# Altium schematic symbol library Linear Technology Power Management Switching Regulator LTC1174-LTC3901.SchLib: 2647 symbols (part 38 of 197)
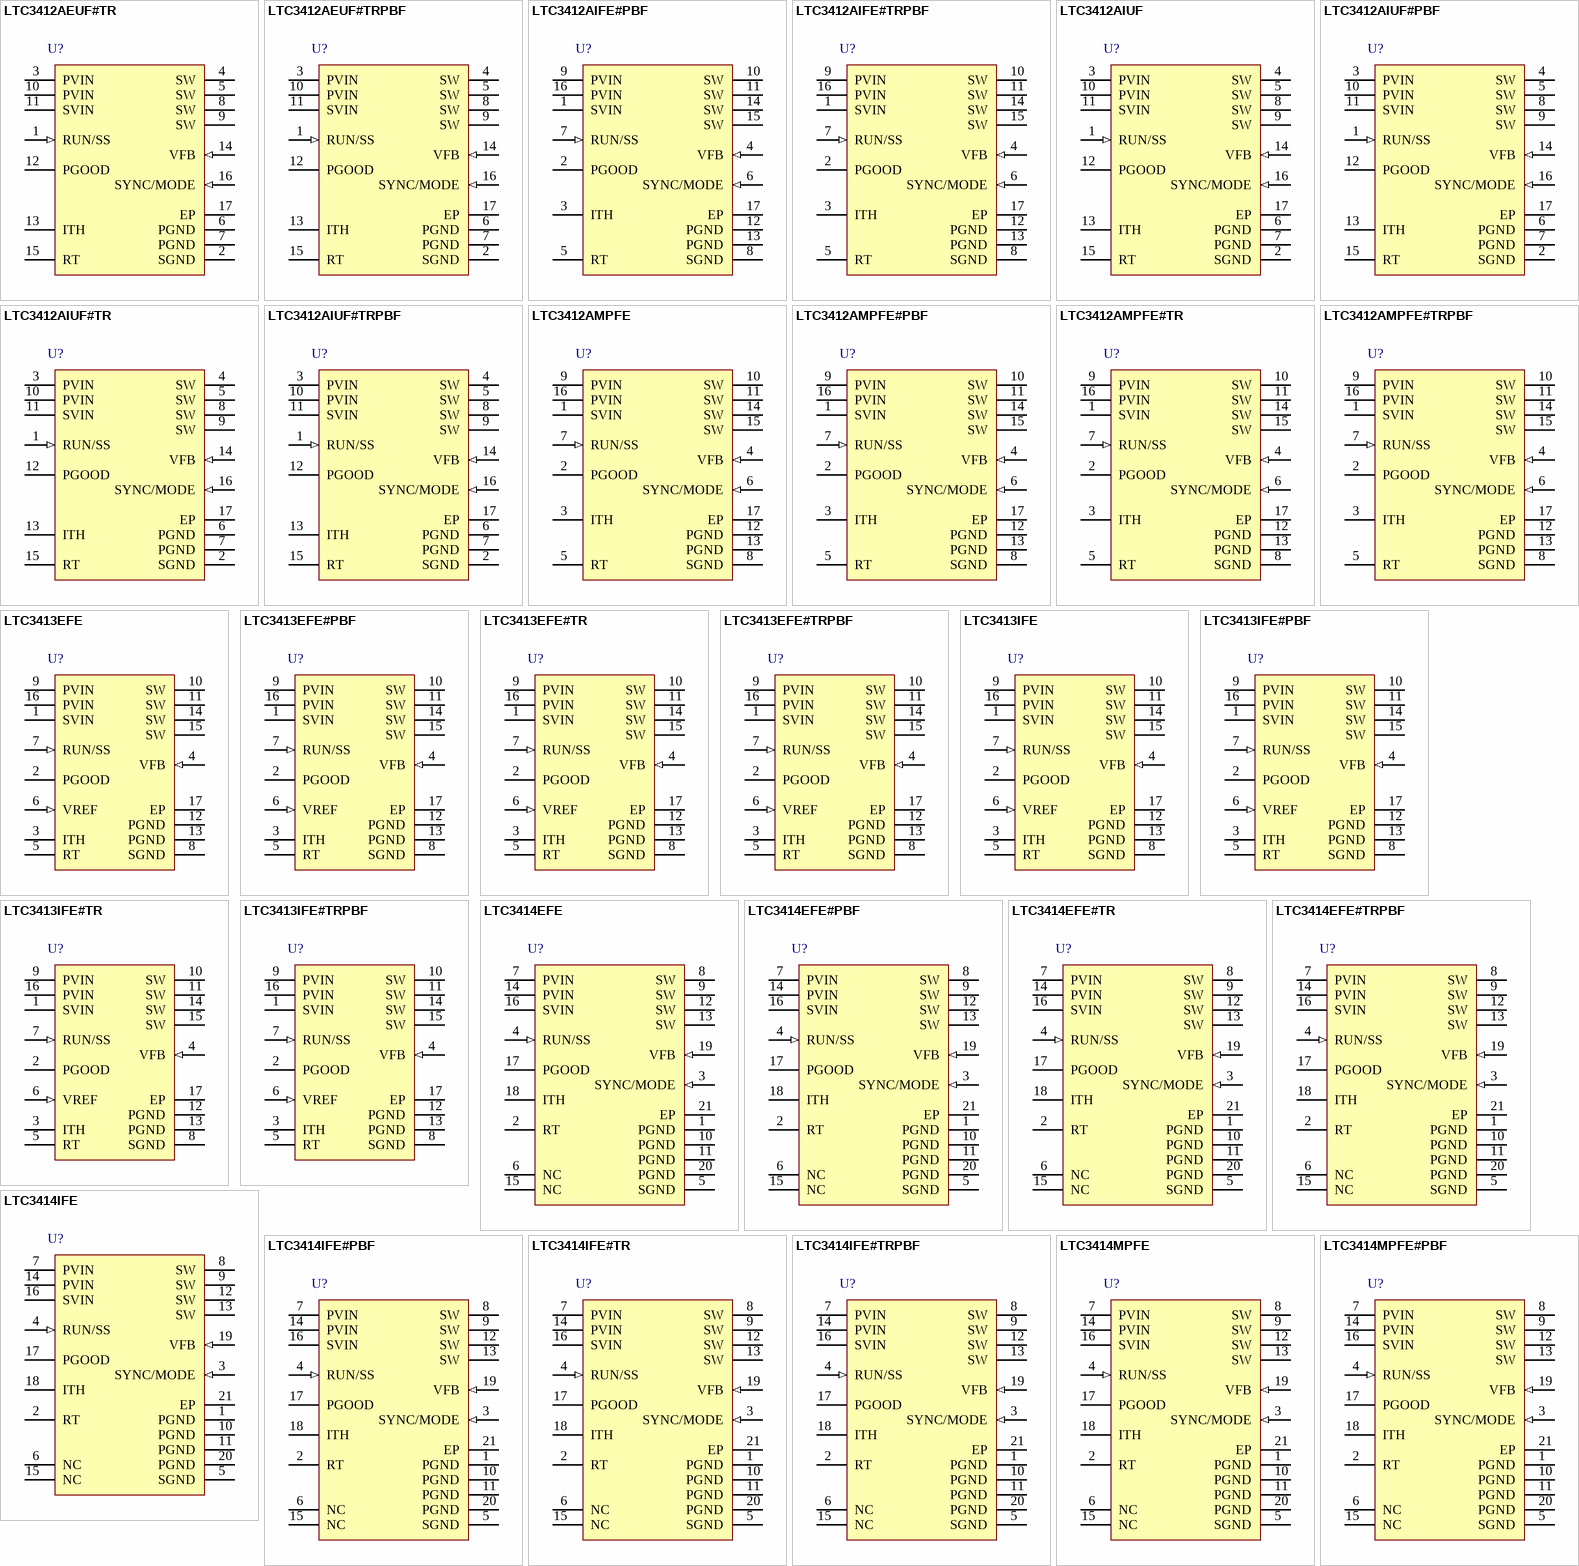
[diagram p153: symbols LTC3412AEUF#TR to LTC3414MPFE#PBF]

## LTC3414MPFE#PBF
designator U?
4 A, 4 MHz, Monolithic Synchronous Step-Down Regulator, 20-pin SOP (FE-20-EPV-CA), -55 to 125 degC, Pb-Free; Manufacturer: Linear Technology; PartNumber: LTC3414MPFE#PBF; Frequency Sync Range: 300kHz - 4MHz; Number of Outputs: 1; DatasheetVersion: Rev. B; PackageVersion: Rev. I, 05/2011; PackageReference: FE-20; PackageDescription: 20-Pin Plastic TSSOP, Body 6.5 x 4.4 mm, Pitch 0.65 mm; Supplier 1: Digi-Key; Supplier Part Number 1: LTC3414MPFE#PBF-ND; Supplier 2: Newark; Supplier Part Number 2: 13T8325; RoHS: TRUE; Mounting Technology: Surface Mount; ComponentLink1Description: Manufacturer URL; ComponentLink1URL: http://www.linear.com/; ComponentLink2Description: Datasheet; ComponentLink2URL: http://cds.linear.com/docs/en/datasheet/3414fb.pdf; ComponentLink3Description: Package Specification; ComponentLink3URL: http://cds.linear.com/docs/en/packaging/05081663__JFE20(CA).pdf
footprint LT-FE-20-EPV-CA_N (SOP, 20-Leads, Body 6.6x4.5mm, Pitch 0.65mm, Thermal Pad 4.95x2.74mm, IPC Medium Density)
footprint LT-FE-20-EPV-CA_L (SOP, 20-Leads, Body 6.6x4.5mm, Pitch 0.65mm, Thermal Pad 4.95x2.74mm, IPC High Density)
footprint LT-FE-20-EPV-CA_M (SOP, 20-Leads, Body 6.6x4.5mm, Pitch 0.65mm, Thermal Pad 4.95x2.74mm, IPC Low Density)
pins: 1 PGND (power) "Power Ground. Connect this pin closely to the (-) terminal of CIN and COUT.", 2 RT "Oscillator Resistor Input. Connecting a resistor to ground from this pin sets the switching frequency.", 3 SYNC/MODE (in) "Mode Select and External Clock Synchronization Input. To select Forced Continuous, tie to SVIN. Connecting this pin to a voltage between 0V and 1V selects Burst Mode operation with the burst clamp set to the pin voltage.", 4 RUN/SS (in) "Run Control and Soft-Start Input. Forcing this pin below 0.5V shuts down the LTC3414. In shutdown all functions are disabled. Less than 1uA of supply current is consumed. A capacitor to ground from this pin sets the ramp (See Datasheet)", 5 SGND (power) "Signal Ground. All small signal components and compensation components should connect to this ground, which in turn connects to PGND at one point.", 6 NC "Open. No internal connection.", 7 PVIN (power) "Power Input Supply. Decouple this pin to PGND with a capacitor.", 8 SW (power) "Switch Node Connection to Inductor. This pin connects to the drains of the internal main and synchronous power MOSFET switches.", 9 SW (power) "Switch Node Connection to Inductor. This pin connects to the drains of the internal main and synchronous power MOSFET switches.", 10 PGND (power) "Power Ground. Connect this pin closely to the (-) terminal of CIN and COUT.", 11 PGND (power) "Power Ground. Connect this pin closely to the (-) terminal of CIN and COUT.", 12 SW (power) "Switch Node Connection to Inductor. This pin connects to the drains of the internal main and synchronous power MOSFET switches.", 13 SW (power) "Switch Node Connection to Inductor. This pin connects to the drains of the internal main and synchronous power MOSFET switches.", 14 PVIN (power) "Power Input Supply. Decouple this pin to PGND with a capacitor.", 15 NC "Open. No internal connection.", 16 SVIN (power) "Signal Input Supply. Decouple this pin to SGND with a capacitor.", 17 PGOOD (oc) "Power Good Output. Open drain logic output that is pulled to ground when the output voltage is not within +/-7.5% of regulation point.", 18 ITH "Error Amplifier Compensation Point. The current comparator threshold increases with this control voltage. Nominal voltage range for this pin is from 0.2V to 1.4V with 0.4V corresponding to the zero-sense voltage (zero (See Datasheet)", 19 VFB (in) "Feedback Pin. Receives the feedback voltage from a resistive divider connected across the output.", 20 PGND (power) "Power Ground. Connect this pin closely to the (-) terminal of CIN and COUT.", 21 EP (power) "Should be connected to SGND and soldered to the PCB."

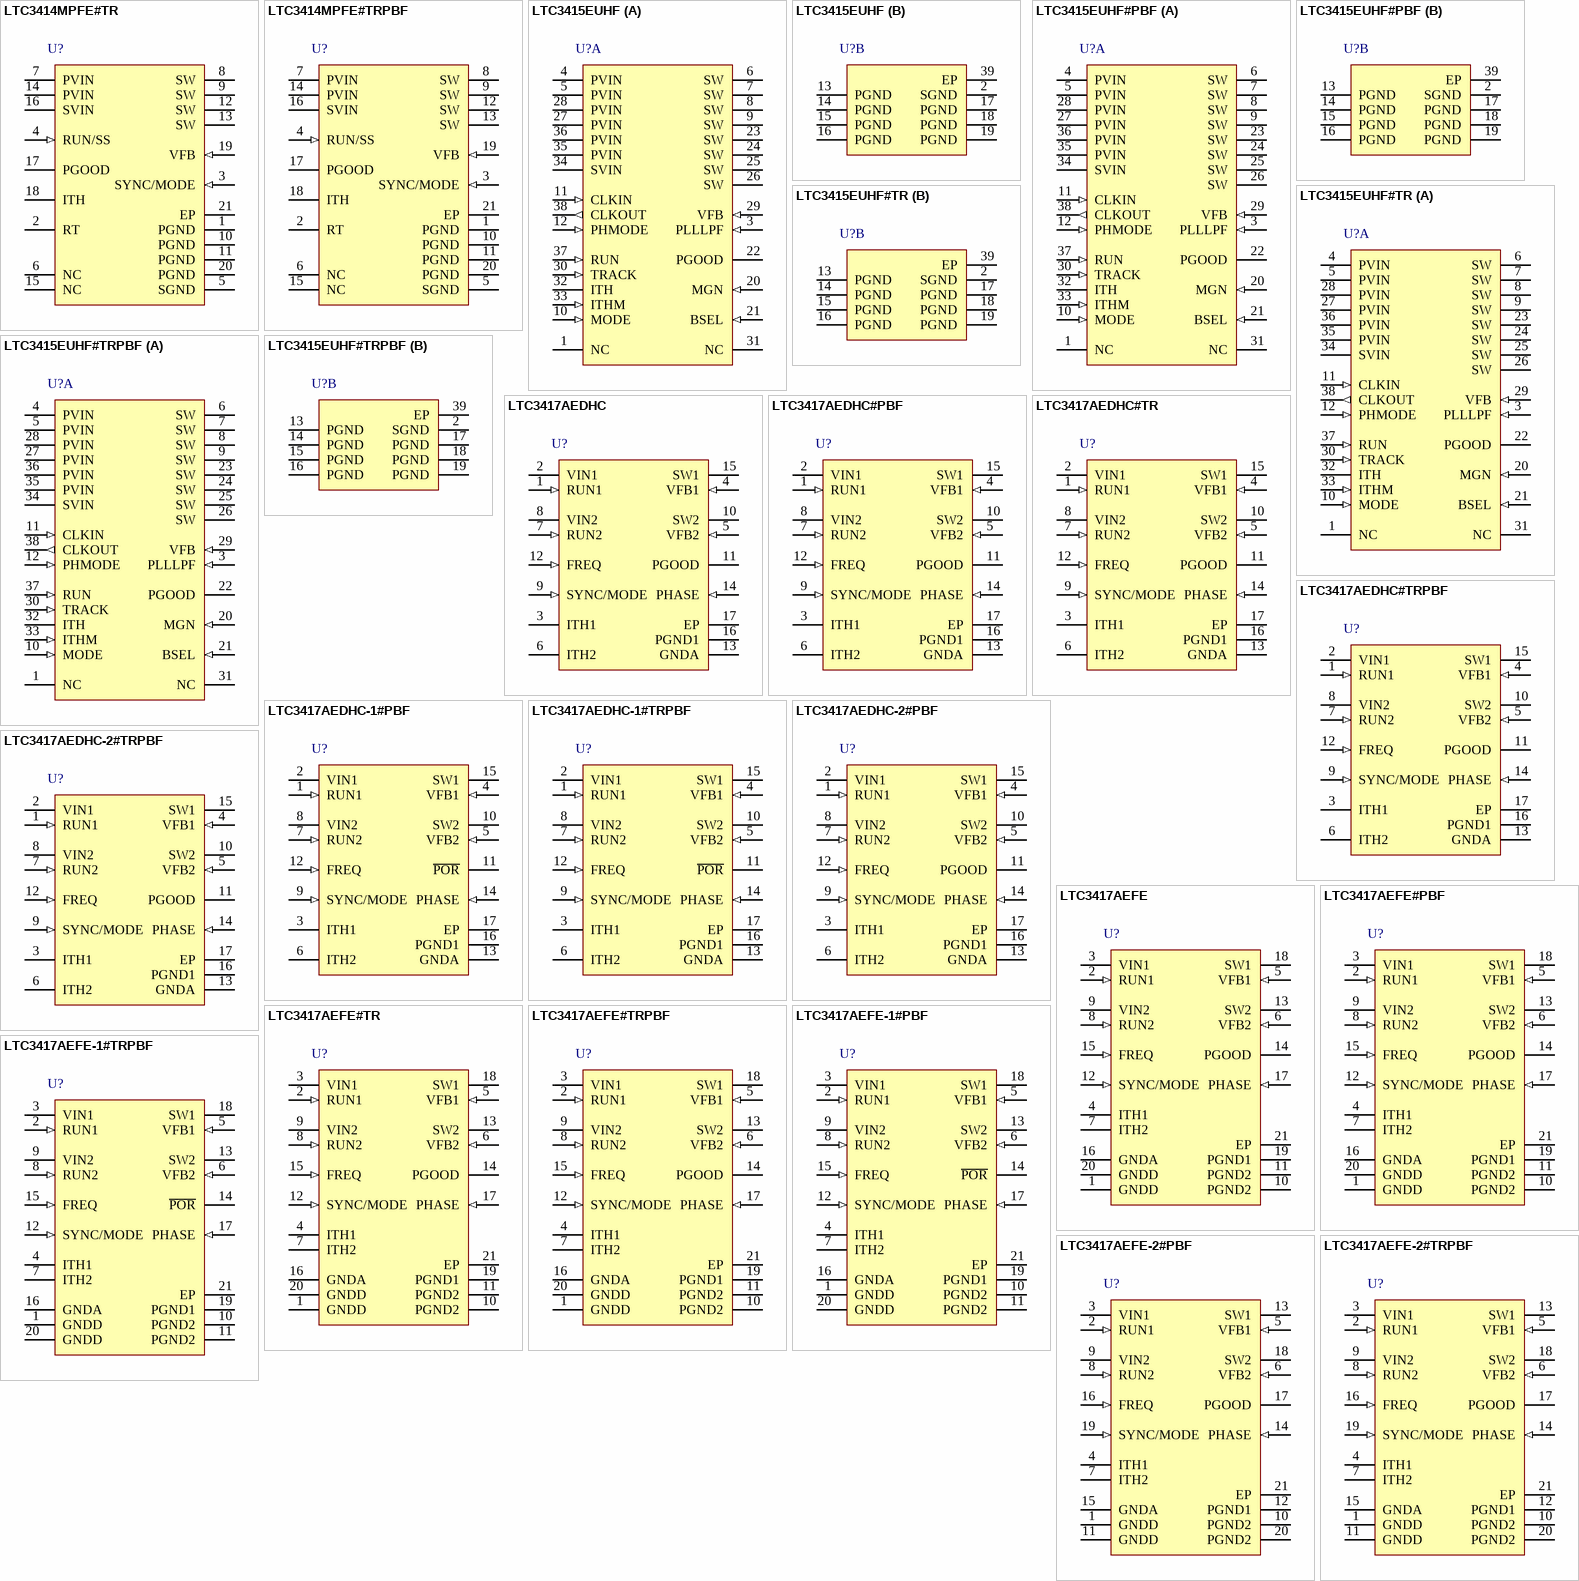
[diagram p23: symbols LTC3414MPFE#TR to LTC3417AEFE-2#TRPBF]

## LTC3414MPFE#TR
designator U?
4 A, 4 MHz, Monolithic Synchronous Step-Down Regulator, 20-pin SOP (FE-20-EPV-CA), -55 to 125 degC, Tape and Reel; Manufacturer: Linear Technology; PartNumber: LTC3414MPFE#TR; Frequency Sync Range: 300kHz - 4MHz; Number of Outputs: 1; DatasheetVersion: Rev. B; PackageVersion: Rev. I, 05/2011; PackageReference: FE-20; PackageDescription: 20-Pin Plastic TSSOP, Body 6.5 x 4.4 mm, Pitch 0.65 mm; Packing: Tape and Reel; RoHS: FALSE; Mounting Technology: Surface Mount; ComponentLink1Description: Manufacturer URL; ComponentLink1URL: http://www.linear.com/; ComponentLink2Description: Datasheet; ComponentLink2URL: http://cds.linear.com/docs/en/datasheet/3414fb.pdf; ComponentLink3Description: Package Specification; ComponentLink3URL: http://cds.linear.com/docs/en/packaging/05081663__JFE20(CA).pdf
footprint LT-FE-20-EPV-CA_N (SOP, 20-Leads, Body 6.6x4.5mm, Pitch 0.65mm, Thermal Pad 4.95x2.74mm, IPC Medium Density)
footprint LT-FE-20-EPV-CA_L (SOP, 20-Leads, Body 6.6x4.5mm, Pitch 0.65mm, Thermal Pad 4.95x2.74mm, IPC High Density)
footprint LT-FE-20-EPV-CA_M (SOP, 20-Leads, Body 6.6x4.5mm, Pitch 0.65mm, Thermal Pad 4.95x2.74mm, IPC Low Density)
pins: 1 PGND (power) "Power Ground. Connect this pin closely to the (-) terminal of CIN and COUT.", 2 RT "Oscillator Resistor Input. Connecting a resistor to ground from this pin sets the switching frequency.", 3 SYNC/MODE (in) "Mode Select and External Clock Synchronization Input. To select Forced Continuous, tie to SVIN. Connecting this pin to a voltage between 0V and 1V selects Burst Mode operation with the burst clamp set to the pin voltage.", 4 RUN/SS (in) "Run Control and Soft-Start Input. Forcing this pin below 0.5V shuts down the LTC3414. In shutdown all functions are disabled. Less than 1uA of supply current is consumed. A capacitor to ground from this pin sets the ramp (See Datasheet)", 5 SGND (power) "Signal Ground. All small signal components and compensation components should connect to this ground, which in turn connects to PGND at one point.", 6 NC "Open. No internal connection.", 7 PVIN (power) "Power Input Supply. Decouple this pin to PGND with a capacitor.", 8 SW (power) "Switch Node Connection to Inductor. This pin connects to the drains of the internal main and synchronous power MOSFET switches.", 9 SW (power) "Switch Node Connection to Inductor. This pin connects to the drains of the internal main and synchronous power MOSFET switches.", 10 PGND (power) "Power Ground. Connect this pin closely to the (-) terminal of CIN and COUT.", 11 PGND (power) "Power Ground. Connect this pin closely to the (-) terminal of CIN and COUT.", 12 SW (power) "Switch Node Connection to Inductor. This pin connects to the drains of the internal main and synchronous power MOSFET switches.", 13 SW (power) "Switch Node Connection to Inductor. This pin connects to the drains of the internal main and synchronous power MOSFET switches.", 14 PVIN (power) "Power Input Supply. Decouple this pin to PGND with a capacitor.", 15 NC "Open. No internal connection.", 16 SVIN (power) "Signal Input Supply. Decouple this pin to SGND with a capacitor.", 17 PGOOD (oc) "Power Good Output. Open drain logic output that is pulled to ground when the output voltage is not within +/-7.5% of regulation point.", 18 ITH "Error Amplifier Compensation Point. The current comparator threshold increases with this control voltage. Nominal voltage range for this pin is from 0.2V to 1.4V with 0.4V corresponding to the zero-sense voltage (zero (See Datasheet)", 19 VFB (in) "Feedback Pin. Receives the feedback voltage from a resistive divider connected across the output.", 20 PGND (power) "Power Ground. Connect this pin closely to the (-) terminal of CIN and COUT.", 21 EP (power) "Should be connected to SGND and soldered to the PCB."

## LTC3414MPFE#TRPBF
designator U?
4 A, 4 MHz, Monolithic Synchronous Step-Down Regulator, 20-pin SOP (FE-20-EPV-CA), -55 to 125 degC, Pb-Free, Tape and Reel; Manufacturer: Linear Technology; PartNumber: LTC3414MPFE#TRPBF; Frequency Sync Range: 300kHz - 4MHz; Number of Outputs: 1; DatasheetVersion: Rev. B; PackageVersion: Rev. I, 05/2011; PackageReference: FE-20; PackageDescription: 20-Pin Plastic TSSOP, Body 6.5 x 4.4 mm, Pitch 0.65 mm; Supplier 1: Digi-Key; Supplier Part Number 1: LTC3414MPFE#TRPBF-ND; Packing: Tape and Reel; RoHS: TRUE; Mounting Technology: Surface Mount; ComponentLink1Description: Manufacturer URL; ComponentLink1URL: http://www.linear.com/; ComponentLink2Description: Datasheet; ComponentLink2URL: http://cds.linear.com/docs/en/datasheet/3414fb.pdf; ComponentLink3Description: Package Specification; ComponentLink3URL: http://cds.linear.com/docs/en/packaging/05081663__JFE20(CA).pdf
footprint LT-FE-20-EPV-CA_N (SOP, 20-Leads, Body 6.6x4.5mm, Pitch 0.65mm, Thermal Pad 4.95x2.74mm, IPC Medium Density)
footprint LT-FE-20-EPV-CA_L (SOP, 20-Leads, Body 6.6x4.5mm, Pitch 0.65mm, Thermal Pad 4.95x2.74mm, IPC High Density)
footprint LT-FE-20-EPV-CA_M (SOP, 20-Leads, Body 6.6x4.5mm, Pitch 0.65mm, Thermal Pad 4.95x2.74mm, IPC Low Density)
pins: 1 PGND (power) "Power Ground. Connect this pin closely to the (-) terminal of CIN and COUT.", 2 RT "Oscillator Resistor Input. Connecting a resistor to ground from this pin sets the switching frequency.", 3 SYNC/MODE (in) "Mode Select and External Clock Synchronization Input. To select Forced Continuous, tie to SVIN. Connecting this pin to a voltage between 0V and 1V selects Burst Mode operation with the burst clamp set to the pin voltage.", 4 RUN/SS (in) "Run Control and Soft-Start Input. Forcing this pin below 0.5V shuts down the LTC3414. In shutdown all functions are disabled. Less than 1uA of supply current is consumed. A capacitor to ground from this pin sets the ramp (See Datasheet)", 5 SGND (power) "Signal Ground. All small signal components and compensation components should connect to this ground, which in turn connects to PGND at one point.", 6 NC "Open. No internal connection.", 7 PVIN (power) "Power Input Supply. Decouple this pin to PGND with a capacitor.", 8 SW (power) "Switch Node Connection to Inductor. This pin connects to the drains of the internal main and synchronous power MOSFET switches.", 9 SW (power) "Switch Node Connection to Inductor. This pin connects to the drains of the internal main and synchronous power MOSFET switches.", 10 PGND (power) "Power Ground. Connect this pin closely to the (-) terminal of CIN and COUT.", 11 PGND (power) "Power Ground. Connect this pin closely to the (-) terminal of CIN and COUT.", 12 SW (power) "Switch Node Connection to Inductor. This pin connects to the drains of the internal main and synchronous power MOSFET switches.", 13 SW (power) "Switch Node Connection to Inductor. This pin connects to the drains of the internal main and synchronous power MOSFET switches.", 14 PVIN (power) "Power Input Supply. Decouple this pin to PGND with a capacitor.", 15 NC "Open. No internal connection.", 16 SVIN (power) "Signal Input Supply. Decouple this pin to SGND with a capacitor.", 17 PGOOD (oc) "Power Good Output. Open drain logic output that is pulled to ground when the output voltage is not within +/-7.5% of regulation point.", 18 ITH "Error Amplifier Compensation Point. The current comparator threshold increases with this control voltage. Nominal voltage range for this pin is from 0.2V to 1.4V with 0.4V corresponding to the zero-sense voltage (zero (See Datasheet)", 19 VFB (in) "Feedback Pin. Receives the feedback voltage from a resistive divider connected across the output.", 20 PGND (power) "Power Ground. Connect this pin closely to the (-) terminal of CIN and COUT.", 21 EP (power) "Should be connected to SGND and soldered to the PCB."

## LTC3415EUHF
designator U?
7 A, PolyPhase Synchronous Step-Down Regulator, 38-pin QFN (UHF-38), -40 to 85 degC; Manufacturer: Linear Technology; PartNumber: LTC3415EUHF; Frequency Sync Range: 750kHz - 2.25MHz; Number of Outputs: 1; DatasheetVersion: Rev. A; PackageVersion: Rev. C, 06/2010; PackageReference: UHF-38; PackageDescription: 38-Pin Plastic QFN, Body 7 x 5 mm, Pitch 0.5 mm; RoHS: FALSE; Mounting Technology: Surface Mount; Code_JEDEC: MO-220; ComponentLink1Description: Manufacturer URL; ComponentLink1URL: http://www.linear.com/; ComponentLink2Description: Datasheet; ComponentLink2URL: http://cds.linear.com/docs/en/datasheet/3415fa.pdf; ComponentLink3Description: Package Specification; ComponentLink3URL: http://cds.linear.com/docs/en/packaging/QFN_38_05-08-1701.pdf
footprint LT-UHF-38_N (QFN, 38-Leads, Body 7.1x5.1mm, Pitch 0.5mm, Thermal Pad 3.15x5.15mm, IPC Medium Density)
footprint LT-UHF-38_L (QFN, 38-Leads, Body 7.1x5.1mm, Pitch 0.5mm, Thermal Pad 3.15x5.15mm, IPC High Density)
footprint LT-UHF-38_M (QFN, 38-Leads, Body 7.1x5.1mm, Pitch 0.5mm, Thermal Pad 3.15x5.15mm, IPC Low Density)
part A pins: 1 NC, 3 PLLLPF (in) "Phase-Locked-Loop Lowpass Filter. The PLL’s lowpass filter is tied to this pin. In spread spectrum mode, placing a capacitor here to SGND controls the slew rate from one frequency to the next. Alternatively, ?o(See Datasheet)", 4 PVIN (power) "Power VIN. Input voltage to the on chip power MOSFETs. Must be closely decoupled to PGND.", 5 PVIN (power) "Power VIN. Input voltage to the on chip power MOSFETs. Must be closely decoupled to PGND.", 6 SW (power) "Switch Node Connection to the Inductor. This pin swings from PVIN to PGND.", 7 SW (power) "Switch Node Connection to the Inductor. This pin swings from PVIN to PGND.", 8 SW (power) "Switch Node Connection to the Inductor. This pin swings from PVIN to PGND.", 9 SW (power) "Switch Node Connection to the Inductor. This pin swings from PVIN to PGND.", 10 MODE (in) "Mode Select Input. Tying this pin high enables Burst Mode operation. Tying this pin low enables force continuous operation. Tying it to VIN/2 enables pulseskipping operation.", 11 CLKIN (in) "External Synchronization Input to Phase Detector. This pin is internally terminated to SGND with a 50k resistor. The phase-locked-loop will force the internal top power PMOS turn on to be synchronized with the rising edge of (See Datasheet)", 12 PHMODE (in) "Phase Selector Input. This pin determines the phase relationship between the internal oscillator and CLKOUT. Tie it high for 2-phase operation, tie it low for 3-phase operation, and tie it to VIN/2 for 4-phase operation.", 20 MGN (in) "Margining Pin. Tying this pin to a voltage between 0.5V and SVIN - 0.5V disables the margining function and allows normal operation. Tying it high enables positive margining (5, 10, or 15%). Tying it low enables negative (See Datasheet)", 21 BSEL (in) "Margining Bit Select Pin. Tying BSEL low selects +/-5%, tying it high selects +/-10%. Tying it to VIN/2 selects +/-15%.", 22 PGOOD (oc) "Output Power GOOD with Open-Drain Logic. PGOOD is pulled to ground when the voltage on the VFB pin is not within +/-10% of its set point. Disabled during margining and during slave mode operation (VFB tied to VIN).", 23 SW (power) "Switch Node Connection to the Inductor. This pin swings from PVIN to PGND.", 24 SW (power) "Switch Node Connection to the Inductor. This pin swings from PVIN to PGND.", 25 SW (power) "Switch Node Connection to the Inductor. This pin swings from PVIN to PGND.", 26 SW (power) "Switch Node Connection to the Inductor. This pin swings from PVIN to PGND.", 27 PVIN (power) "Power VIN. Input voltage to the on chip power MOSFETs. Must be closely decoupled to PGND.", 28 PVIN (power) "Power VIN. Input voltage to the on chip power MOSFETs. Must be closely decoupled to PGND.", 29 VFB (in) "Input to the error ampli?er that compares the feedback voltage to the internal 0.6V reference voltage. This pin is normally connected to a resistive divider from the output voltage. In PolyPhase operation, tying VFB t(See Datasheet)", 30 TRACK (in) "Track Input Pin. This allows the user to control the rise time of the output. Putting a voltage below 0.57V on this pin bypasses the reference input into the error ampli?er and servos the VFB pin to the TRACK voltage(See Datasheet)", 31 NC, 32 ITH "Error Ampli?er Output and Switching Regulator Compensation Point. The current comparator’s threshold increases with this control voltage. The normal voltage range of this pin is from 0V to 1.5V. It’s also the pos(See Datasheet)", 33 ITHM (in) "Negative Input to the Internal ITH Differential Ampli?er. Tie this pin to SGND for single phase operation. For PolyPhase, tie the master’s ITHM to SGND while connecting all of the ITHM pins together.", 34 SVIN (power) "Signal Input Voltage. Connect this pin to PVIN through a 1ohm and 0.1uF lowpass ?lter", 35 PVIN (power) "Power VIN. Input voltage to the on chip power MOSFETs. Must be closely decoupled to PGND.", 36 PVIN (power) "Power VIN. Input voltage to the on chip power MOSFETs. Must be closely decoupled to PGND.", 37 RUN (in) "Run Control Input. Tying this pin above 1.5V turns on the part.", 38 CLKOUT (out) "Output Clock Signal for PolyPhase Operation. The phase of CLKOUT is determined by the state of the PHMODE pin."
part B pins: 2 SGND (power) "Signal Ground. Return ground path for all analog and low power circuitry. Single connection to PGND on system board.", 13 PGND (power) "Power Ground. Return path of internal N-channel power MOSFETs. Connect this pin with the (-) terminals of CIN and COUT.", 14 PGND (power) "Power Ground. Return path of internal N-channel power MOSFETs. Connect this pin with the (-) terminals of CIN and COUT.", 15 PGND (power) "Power Ground. Return path of internal N-channel power MOSFETs. Connect this pin with the (-) terminals of CIN and COUT.", 16 PGND (power) "Power Ground. Return path of internal N-channel power MOSFETs. Connect this pin with the (-) terminals of CIN and COUT.", 17 PGND (power) "Power Ground. Return path of internal N-channel power MOSFETs. Connect this pin with the (-) terminals of CIN and COUT.", 18 PGND (power) "Power Ground. Return path of internal N-channel power MOSFETs. Connect this pin with the (-) terminals of CIN and COUT.", 19 PGND (power) "Power Ground. Return path of internal N-channel power MOSFETs. Connect this pin with the (-) terminals of CIN and COUT.", 39 EP (power) "Power Ground. Must be connected to electrical ground on PCB."

## LTC3415EUHF#PBF
designator U?
7 A, PolyPhase Synchronous Step-Down Regulator, 38-pin QFN (UHF-38), -40 to 85 degC, Pb-Free; Manufacturer: Linear Technology; PartNumber: LTC3415EUHF#PBF; Frequency Sync Range: 750kHz - 2.25MHz; Number of Outputs: 1; DatasheetVersion: Rev. A; PackageVersion: Rev. C, 06/2010; PackageReference: UHF-38; PackageDescription: 38-Pin Plastic QFN, Body 7 x 5 mm, Pitch 0.5 mm; Supplier 1: Digi-Key; Supplier Part Number 1: LTC3415EUHF#PBF-ND; Supplier 2: Farnell; Supplier Part Number 2: 2295050; Supplier 3: Newark; Supplier Part Number 3: 56M7718; RoHS: TRUE; Mounting Technology: Surface Mount; Code_JEDEC: MO-220; ComponentLink1Description: Manufacturer URL; ComponentLink1URL: http://www.linear.com/; ComponentLink2Description: Datasheet; ComponentLink2URL: http://cds.linear.com/docs/en/datasheet/3415fa.pdf; ComponentLink3Description: Package Specification; ComponentLink3URL: http://cds.linear.com/docs/en/packaging/QFN_38_05-08-1701.pdf
footprint LT-UHF-38_N (QFN, 38-Leads, Body 7.1x5.1mm, Pitch 0.5mm, Thermal Pad 3.15x5.15mm, IPC Medium Density)
footprint LT-UHF-38_L (QFN, 38-Leads, Body 7.1x5.1mm, Pitch 0.5mm, Thermal Pad 3.15x5.15mm, IPC High Density)
footprint LT-UHF-38_M (QFN, 38-Leads, Body 7.1x5.1mm, Pitch 0.5mm, Thermal Pad 3.15x5.15mm, IPC Low Density)
part A pins: 1 NC, 3 PLLLPF (in) "Phase-Locked-Loop Lowpass Filter. The PLL’s lowpass filter is tied to this pin. In spread spectrum mode, placing a capacitor here to SGND controls the slew rate from one frequency to the next. Alternatively, ?o(See Datasheet)", 4 PVIN (power) "Power VIN. Input voltage to the on chip power MOSFETs. Must be closely decoupled to PGND.", 5 PVIN (power) "Power VIN. Input voltage to the on chip power MOSFETs. Must be closely decoupled to PGND.", 6 SW (power) "Switch Node Connection to the Inductor. This pin swings from PVIN to PGND.", 7 SW (power) "Switch Node Connection to the Inductor. This pin swings from PVIN to PGND.", 8 SW (power) "Switch Node Connection to the Inductor. This pin swings from PVIN to PGND.", 9 SW (power) "Switch Node Connection to the Inductor. This pin swings from PVIN to PGND.", 10 MODE (in) "Mode Select Input. Tying this pin high enables Burst Mode operation. Tying this pin low enables force continuous operation. Tying it to VIN/2 enables pulseskipping operation.", 11 CLKIN (in) "External Synchronization Input to Phase Detector. This pin is internally terminated to SGND with a 50k resistor. The phase-locked-loop will force the internal top power PMOS turn on to be synchronized with the rising edge of (See Datasheet)", 12 PHMODE (in) "Phase Selector Input. This pin determines the phase relationship between the internal oscillator and CLKOUT. Tie it high for 2-phase operation, tie it low for 3-phase operation, and tie it to VIN/2 for 4-phase operation.", 20 MGN (in) "Margining Pin. Tying this pin to a voltage between 0.5V and SVIN - 0.5V disables the margining function and allows normal operation. Tying it high enables positive margining (5, 10, or 15%). Tying it low enables negative (See Datasheet)", 21 BSEL (in) "Margining Bit Select Pin. Tying BSEL low selects +/-5%, tying it high selects +/-10%. Tying it to VIN/2 selects +/-15%.", 22 PGOOD (oc) "Output Power GOOD with Open-Drain Logic. PGOOD is pulled to ground when the voltage on the VFB pin is not within +/-10% of its set point. Disabled during margining and during slave mode operation (VFB tied to VIN).", 23 SW (power) "Switch Node Connection to the Inductor. This pin swings from PVIN to PGND.", 24 SW (power) "Switch Node Connection to the Inductor. This pin swings from PVIN to PGND.", 25 SW (power) "Switch Node Connection to the Inductor. This pin swings from PVIN to PGND.", 26 SW (power) "Switch Node Connection to the Inductor. This pin swings from PVIN to PGND.", 27 PVIN (power) "Power VIN. Input voltage to the on chip power MOSFETs. Must be closely decoupled to PGND.", 28 PVIN (power) "Power VIN. Input voltage to the on chip power MOSFETs. Must be closely decoupled to PGND.", 29 VFB (in) "Input to the error ampli?er that compares the feedback voltage to the internal 0.6V reference voltage. This pin is normally connected to a resistive divider from the output voltage. In PolyPhase operation, tying VFB t(See Datasheet)", 30 TRACK (in) "Track Input Pin. This allows the user to control the rise time of the output. Putting a voltage below 0.57V on this pin bypasses the reference input into the error ampli?er and servos the VFB pin to the TRACK voltage(See Datasheet)", 31 NC, 32 ITH "Error Ampli?er Output and Switching Regulator Compensation Point. The current comparator’s threshold increases with this control voltage. The normal voltage range of this pin is from 0V to 1.5V. It’s also the pos(See Datasheet)", 33 ITHM (in) "Negative Input to the Internal ITH Differential Ampli?er. Tie this pin to SGND for single phase operation. For PolyPhase, tie the master’s ITHM to SGND while connecting all of the ITHM pins together.", 34 SVIN (power) "Signal Input Voltage. Connect this pin to PVIN through a 1ohm and 0.1uF lowpass ?lter", 35 PVIN (power) "Power VIN. Input voltage to the on chip power MOSFETs. Must be closely decoupled to PGND.", 36 PVIN (power) "Power VIN. Input voltage to the on chip power MOSFETs. Must be closely decoupled to PGND.", 37 RUN (in) "Run Control Input. Tying this pin above 1.5V turns on the part.", 38 CLKOUT (out) "Output Clock Signal for PolyPhase Operation. The phase of CLKOUT is determined by the state of the PHMODE pin."